# Altium schematic symbol library Wurth_Elektronik_Passive_rev16a.SCHLIB: 1143 symbols (part 15 of 27)
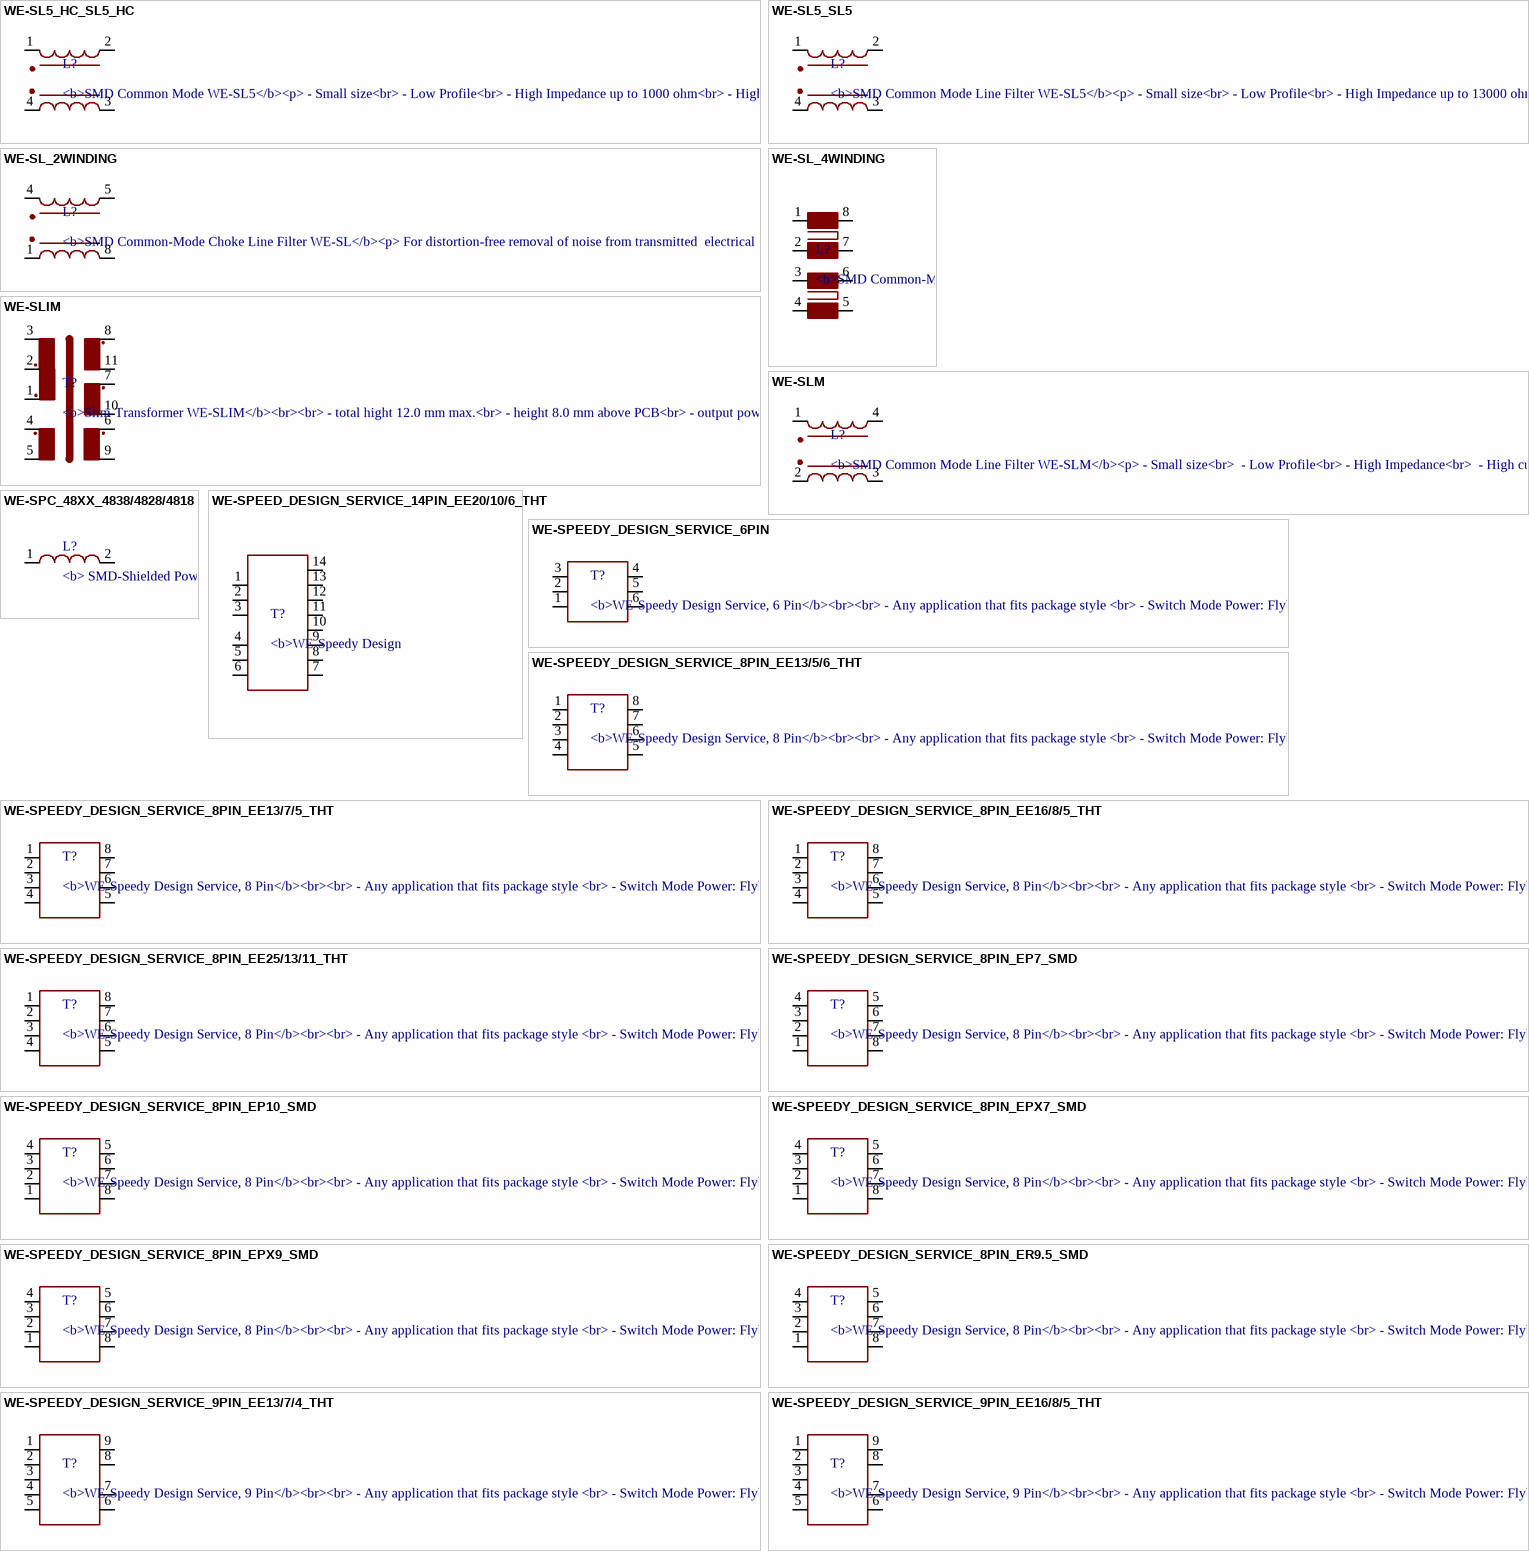
[diagram p72: symbols WE-SL5_HC_SL5_HC to WE-SPEEDY_DESIGN_SERVICE_9PIN_EE16/8/5_THT]

## WE-SL_4WINDING
designator L?, comment <b>SMD Common-Mode Choke Line Filter WE-SL</b><p> / For distortion-free removal of noise from transmitted / electrical signals<br> / - 2 or 4 winding configuration<br> / - Offering a wide band width with the core materials of NiZn and MnZn<br><br> / -- Current compensated choke for data and signal lines<br> / -- USB/CAN/ISDN-Bus<br> / -- Power supply systems<br> / -- Control lines<br> / -- LAN, PBX, cable TV, CD-ROM, 8mm video, etc. / <br><a href="http://katalog.we-online.de/media/images/eisos/IndSL_pf2.jpg" title="Enlarge picture"> / <img src="http://katalog.we-online.de/media/images/eisos/IndSL_pf2.jpg" width="320"></a><p> / Details see: <a href="http://katalog.we-online.de/en/pbs/WE-SL?">http://katalog.we-online.de/en/pbs/WE-SL?</a><p> / </b>Updated  by  Dan Xu 2014-07-11<br> / </b>2014 (C) Würth Elektronik
footprint WE-SL_4WINDING
pins: 1, 2, 3, 4, 5, 6, 7, 8

## WE-SLIM
designator T?, comment <b>Slim-Transformer WE-SLIM</b><br><br> / - total hight 12.0 mm max.<br> / - height 8.0 mm above PCB<br> / - output power 65W<br><br> / -- offline switch mode power supplies<br> / -- TV<br> / -- devices with heigh issues / <br><a href="http://katalog.we-online.de/media/images/ctm/UtSLIM_pf2.jpg" title="Enlarge picture"> / <img src="http://katalog.we-online.de/media/images/ctm/UtSLIM_pf2.jpg" width="320"></a><p> / Details see: <a href="http://katalog.we-online.de/en/ctm/MID-SLIM?">http://katalog.we-online.de/en/ctm/MID-SLIM?</a><p> / </b>Updated  by  Dan Xu 2014-07-11<br> / </b>2014 (C) Würth Elektronik
footprint WE_LEP28/11.2_6PIN
pins: 1, 2, 3, 4, 5, 6, 7, 8, 9, 10, 11

## WE-SLM
designator L?, comment <b>SMD Common Mode Line Filter WE-SLM</b><p> / - Small size<br> / - Low Profile<br> / - High Impedance<br> / - High current capability up to 300 mA<p> / -- USB<br> / -- CAN<br> / -- Firewire<br> / -- Data Lines<br> / -- Power supply systems<br> / -- Signal Lines / <br><a href="http://katalog.we-online.de/media/images/eisos/IndSLM_pf2.jpg" title="Enlarge picture"> / <img src="http://katalog.we-online.de/media/images/eisos/IndSLM_pf2.jpg" width="320"></a><p> / Details see: <a href="http://katalog.we-online.de/en/pbs/WE-SLM??">http://katalog.we-online.de/en/pbs/WE-SLM??</a><p> / </b>Updated  by  Dan Xu 2014-07-11<br> / </b>2014 (C) Würth Elektronik
footprint WE-SLM
pins: 1, 2 4, 3, 4 2

## WE-SPC_48XX_4838/4828/4818
designator L?, comment <b> SMD-Shielded Power Inductor  WE-SPC / <br><a href="http://katalog.we-online.de/media/images/eisos/IndSPC_pf2.jpg" title="Enlarge picture"> / <img src="http://katalog.we-online.de/media/images/eisos/IndSPC_pf2.jpg" width="320"></a><p> / Details see: <a href="http://katalog.we-online.de/en/pbs/WE-SPC?">http://katalog.we-online.de/en/pbs/WE-SPC?</a><p> / </b>Updated  by  Dan Xu 2014-07-11<br> / </b>2014 (C) Würth Elektronik
footprint WE-SPC_48XX
pins: 1, 2

## WE-SPEED_DESIGN_SERVICE_14PIN_EE20/10/6_THT
designator T?, comment <b>WE-Speedy Design Service, 14 Pin</b><br><br> / - Any application that fits package style <br> / - Switch Mode Power: Flyback, Forward, Push-Pull, Coupled Inductor<br><br> / -- Telecom Applications: xDSL, POTS Splitter Inductors
footprint WE_EE20/10/6_THT_HORIZONTAL_14PIN
pins: 1, 2, 3, 4, 5, 6, 7, 8, 9, 10, 11, 12, 13, 14

## WE-SPEEDY_DESIGN_SERVICE_6PIN
designator T?, comment <b>WE-Speedy Design Service, 6 Pin</b><br><br> / - Any application that fits package style <br> / - Switch Mode Power: Flyback, Forward, Push-Pull, Coupled Inductor<br><br> / -- Telecom Applications: xDSL, POTS Splitter Inductors
footprint WE_EP5_SMD_6PIN
pins: 1, 2, 3, 4, 5, 6

## WE-SPEEDY_DESIGN_SERVICE_8PIN_EE13/5/6_THT
designator T?, comment <b>WE-Speedy Design Service, 8 Pin</b><br><br> / - Any application that fits package style <br> / - Switch Mode Power: Flyback, Forward, Push-Pull, Coupled Inductor<br><br> / -- Telecom Applications: xDSL, POTS Splitter Inductors
footprint WE_EE13/5/6_HORIZONTAL_8PIN
pins: 1 4, 2 3, 3 2, 4 1, 5 8, 6 7, 7 6, 8 5

## WE-SPEEDY_DESIGN_SERVICE_8PIN_EE13/7/5_THT
designator T?, comment <b>WE-Speedy Design Service, 8 Pin</b><br><br> / - Any application that fits package style <br> / - Switch Mode Power: Flyback, Forward, Push-Pull, Coupled Inductor<br><br> / -- Telecom Applications: xDSL, POTS Splitter Inductors
footprint WE_EE13/7/4_HORIZONTAL_8PIN
pins: 1 4, 2 3, 3 2, 4 1, 5 8, 6 7, 7 6, 8 5

## WE-SPEEDY_DESIGN_SERVICE_8PIN_EE16/8/5_THT
designator T?, comment <b>WE-Speedy Design Service, 8 Pin</b><br><br> / - Any application that fits package style <br> / - Switch Mode Power: Flyback, Forward, Push-Pull, Coupled Inductor<br><br> / -- Telecom Applications: xDSL, POTS Splitter Inductors
footprint WE_EE16/8/5_THT_HORIZONTAL_8PIN
pins: 1 4, 2 3, 3 2, 4 1, 5 8, 6 7, 7 6, 8 5

## WE-SPEEDY_DESIGN_SERVICE_8PIN_EE25/13/11_THT
designator T?, comment <b>WE-Speedy Design Service, 8 Pin</b><br><br> / - Any application that fits package style <br> / - Switch Mode Power: Flyback, Forward, Push-Pull, Coupled Inductor<br><br> / -- Telecom Applications: xDSL, POTS Splitter Inductors
footprint WE_EE25/13/11_THT_VERTICAL_8PIN
pins: 1 4, 2 3, 3 2, 4 1, 5 8, 6 7, 7 6, 8 5

## WE-SPEEDY_DESIGN_SERVICE_8PIN_EP7_SMD
designator T?, comment <b>WE-Speedy Design Service, 8 Pin</b><br><br> / - Any application that fits package style <br> / - Switch Mode Power: Flyback, Forward, Push-Pull, Coupled Inductor<br><br> / -- Telecom Applications: xDSL, POTS Splitter Inductors
footprint WE_EP7_SMD_8PIN
pins: 1, 2, 3, 4, 5, 6, 7, 8

## WE-SPEEDY_DESIGN_SERVICE_8PIN_EP10_SMD
designator T?, comment <b>WE-Speedy Design Service, 8 Pin</b><br><br> / - Any application that fits package style <br> / - Switch Mode Power: Flyback, Forward, Push-Pull, Coupled Inductor<br><br> / -- Telecom Applications: xDSL, POTS Splitter Inductors
footprint WE_EP10_SMD_8PIN
pins: 1, 2, 3, 4, 5, 6, 7, 8

## WE-SPEEDY_DESIGN_SERVICE_8PIN_EPX7_SMD
designator T?, comment <b>WE-Speedy Design Service, 8 Pin</b><br><br> / - Any application that fits package style <br> / - Switch Mode Power: Flyback, Forward, Push-Pull, Coupled Inductor<br><br> / -- Telecom Applications: xDSL, POTS Splitter Inductors
footprint WE_EPX7_SMD_8PIN
pins: 1, 2, 3, 4, 5, 6, 7, 8

## WE-SPEEDY_DESIGN_SERVICE_8PIN_EPX9_SMD
designator T?, comment <b>WE-Speedy Design Service, 8 Pin</b><br><br> / - Any application that fits package style <br> / - Switch Mode Power: Flyback, Forward, Push-Pull, Coupled Inductor<br><br> / -- Telecom Applications: xDSL, POTS Splitter Inductors
footprint WE_EPX9_SMD_8PIN
pins: 1, 2, 3, 4, 5, 6, 7, 8

## WE-SPEEDY_DESIGN_SERVICE_8PIN_ER9.5_SMD
designator T?, comment <b>WE-Speedy Design Service, 8 Pin</b><br><br> / - Any application that fits package style <br> / - Switch Mode Power: Flyback, Forward, Push-Pull, Coupled Inductor<br><br> / -- Telecom Applications: xDSL, POTS Splitter Inductors
footprint WE_ER9.5_SMD_8PIN
pins: 1, 2, 3, 4, 5, 6, 7, 8

## WE-SPEEDY_DESIGN_SERVICE_9PIN_EE13/7/4_THT
designator T?, comment <b>WE-Speedy Design Service, 9 Pin</b><br><br> / - Any application that fits package style <br> / - Switch Mode Power: Flyback, Forward, Push-Pull, Coupled Inductor<br><br> / -- Telecom Applications: xDSL, POTS Splitter Inductors
footprint WE_E13/7/4_THT_HORIZONTAL_9PIN
pins: 1 5, 2 4, 3, 4 2, 5 1, 6 9, 7 8, 8 7, 9 6

## WE-SPEEDY_DESIGN_SERVICE_9PIN_EE16/8/5_THT
designator T?, comment <b>WE-Speedy Design Service, 9 Pin</b><br><br> / - Any application that fits package style <br> / - Switch Mode Power: Flyback, Forward, Push-Pull, Coupled Inductor<br><br> / -- Telecom Applications: xDSL, POTS Splitter Inductors
footprint WE_EE16/8/5_THT_HORIZONTAL_9PIN
pins: 1 5, 2 4, 3, 4 2, 5 1, 6 9, 7 8, 8 7, 9 6

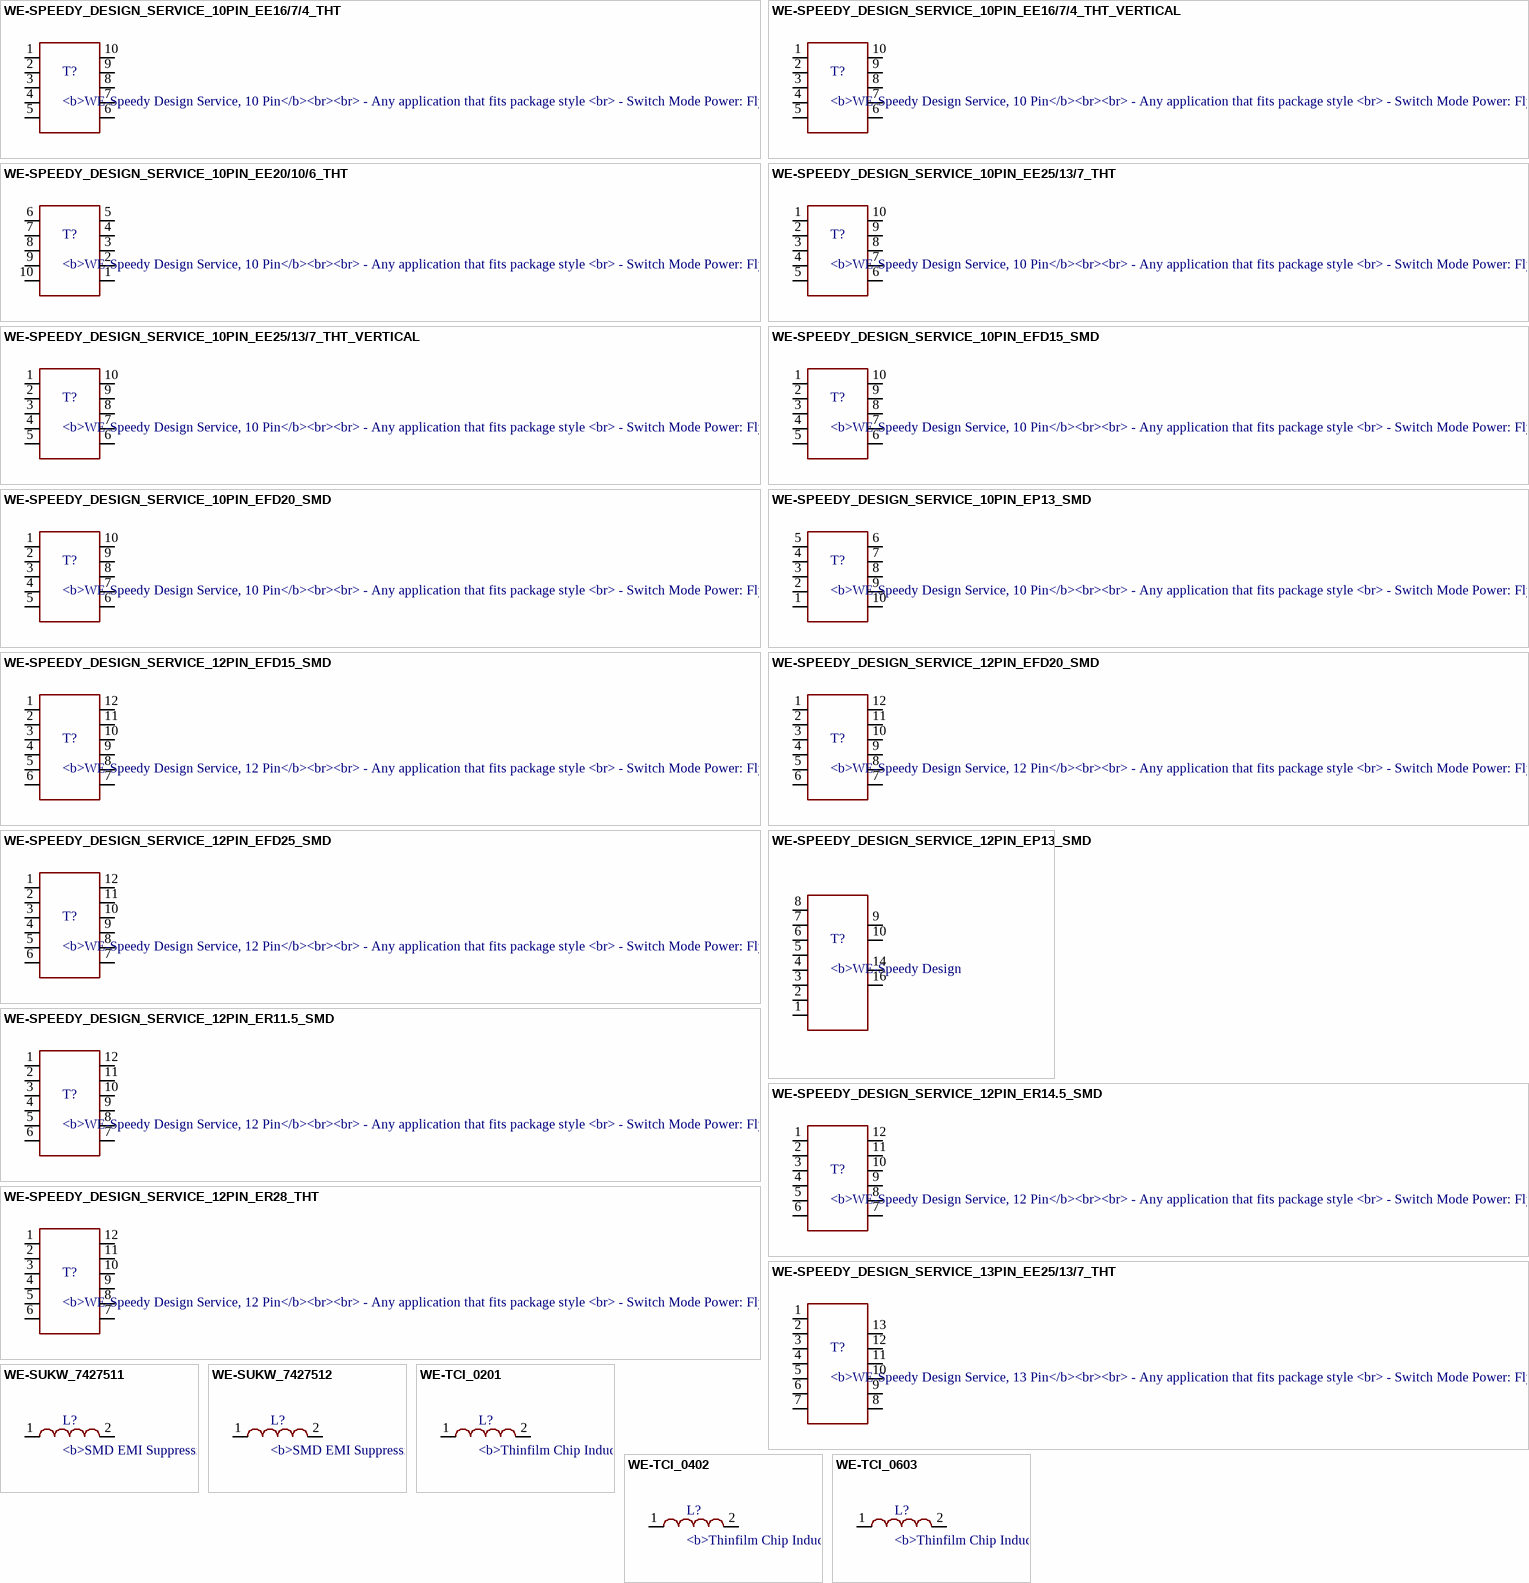
[diagram p45: symbols WE-SPEEDY_DESIGN_SERVICE_10PIN_EE16/7/4_THT to WE-TCI_0603]

## WE-SPEEDY_DESIGN_SERVICE_10PIN_EE16/7/4_THT
designator T?, comment <b>WE-Speedy Design Service, 10 Pin</b><br><br> / - Any application that fits package style <br> / - Switch Mode Power: Flyback, Forward, Push-Pull, Coupled Inductor<br><br> / -- Telecom Applications: xDSL, POTS Splitter Inductors
footprint WE_EE16/7/4_THT_HORIZONTAL_10PIN
pins: 1, 2, 3, 4, 5, 6, 7, 8, 9, 10

## WE-SPEEDY_DESIGN_SERVICE_10PIN_EE16/7/4_THT_VERTICAL
designator T?, comment <b>WE-Speedy Design Service, 10 Pin</b><br><br> / - Any application that fits package style <br> / - Switch Mode Power: Flyback, Forward, Push-Pull, Coupled Inductor<br><br> / -- Telecom Applications: xDSL, POTS Splitter Inductors
footprint WE_E16/7/4_THT_VERTIKAL_10PIN
pins: 1, 2, 3, 4, 5, 6, 7, 8, 9, 10

## WE-SPEEDY_DESIGN_SERVICE_10PIN_EE20/10/6_THT
designator T?, comment <b>WE-Speedy Design Service, 10 Pin</b><br><br> / - Any application that fits package style <br> / - Switch Mode Power: Flyback, Forward, Push-Pull, Coupled Inductor<br><br> / -- Telecom Applications: xDSL, POTS Splitter Inductors
footprint WE_EE20/10/6_THT_HORIZONTAL_10PIN
pins: 1 6, 2 7, 3 8, 4 9, 5 10, 6 1, 7 2, 8 3, 9 4, 10 5

## WE-SPEEDY_DESIGN_SERVICE_10PIN_EE25/13/7_THT
designator T?, comment <b>WE-Speedy Design Service, 10 Pin</b><br><br> / - Any application that fits package style <br> / - Switch Mode Power: Flyback, Forward, Push-Pull, Coupled Inductor<br><br> / -- Telecom Applications: xDSL, POTS Splitter Inductors
footprint WE_EE25/13/7_THT_HORIZONTAL_10PIN
pins: 1, 2, 3, 4, 5, 6, 7, 8, 9, 10

## WE-SPEEDY_DESIGN_SERVICE_10PIN_EE25/13/7_THT_VERTICAL
designator T?, comment <b>WE-Speedy Design Service, 10 Pin</b><br><br> / - Any application that fits package style <br> / - Switch Mode Power: Flyback, Forward, Push-Pull, Coupled Inductor<br><br> / -- Telecom Applications: xDSL, POTS Splitter Inductors
footprint WE_EE25/13/7_THT_VERTICAL_10PIN
pins: 1, 2, 3, 4, 5, 6, 7, 8, 9, 10

## WE-SPEEDY_DESIGN_SERVICE_10PIN_EFD15_SMD
designator T?, comment <b>WE-Speedy Design Service, 10 Pin</b><br><br> / - Any application that fits package style <br> / - Switch Mode Power: Flyback, Forward, Push-Pull, Coupled Inductor<br><br> / -- Telecom Applications: xDSL, POTS Splitter Inductors
footprint WE_EFD15_SMD_10PIN
pins: 1, 2, 3, 4, 5, 6, 7, 8, 9, 10

## WE-SPEEDY_DESIGN_SERVICE_10PIN_EFD20_SMD
designator T?, comment <b>WE-Speedy Design Service, 10 Pin</b><br><br> / - Any application that fits package style <br> / - Switch Mode Power: Flyback, Forward, Push-Pull, Coupled Inductor<br><br> / -- Telecom Applications: xDSL, POTS Splitter Inductors
footprint WE_EFD20_SMD_10PIN
pins: 1, 2, 3, 4, 5, 6, 7, 8, 9, 10

## WE-SPEEDY_DESIGN_SERVICE_10PIN_EP13_SMD
designator T?, comment <b>WE-Speedy Design Service, 10 Pin</b><br><br> / - Any application that fits package style <br> / - Switch Mode Power: Flyback, Forward, Push-Pull, Coupled Inductor<br><br> / -- Telecom Applications: xDSL, POTS Splitter Inductors
footprint WE_EP13_SMD_10PIN
pins: 1 5, 2 4, 3, 4 2, 5 1, 6 10, 7 9, 8, 9 7, 10 6

## WE-SPEEDY_DESIGN_SERVICE_12PIN_EFD15_SMD
designator T?, comment <b>WE-Speedy Design Service, 12 Pin</b><br><br> / - Any application that fits package style <br> / - Switch Mode Power: Flyback, Forward, Push-Pull, Coupled Inductor<br><br> / -- Telecom Applications: xDSL, POTS Splitter Inductors
footprint WE_EFD15_SMD_12PIN
pins: 1, 2, 3, 4, 5, 6, 7, 8, 9, 10, 11, 12

## WE-SPEEDY_DESIGN_SERVICE_12PIN_EFD20_SMD
designator T?, comment <b>WE-Speedy Design Service, 12 Pin</b><br><br> / - Any application that fits package style <br> / - Switch Mode Power: Flyback, Forward, Push-Pull, Coupled Inductor<br><br> / -- Telecom Applications: xDSL, POTS Splitter Inductors
footprint WE_EFD20_SMD_12PIN
pins: 1, 2, 3, 4, 5, 6, 7, 8, 9, 10, 11, 12

## WE-SPEEDY_DESIGN_SERVICE_12PIN_EFD25_SMD
designator T?, comment <b>WE-Speedy Design Service, 12 Pin</b><br><br> / - Any application that fits package style <br> / - Switch Mode Power: Flyback, Forward, Push-Pull, Coupled Inductor<br><br> / -- Telecom Applications: xDSL, POTS Splitter Inductors
footprint WE_EFD25_SMD_12PIN
pins: 1, 2, 3, 4, 5, 6, 7, 8, 9, 10, 11, 12

## WE-SPEEDY_DESIGN_SERVICE_12PIN_EP13_SMD
designator T?, comment <b>WE-Speedy Design Service, 12 Pin</b><br><br> / - Any application that fits package style <br> / - Switch Mode Power: Flyback, Forward, Push-Pull, Coupled Inductor<br><br> / -- Telecom Applications: xDSL, POTS Splitter Inductors
footprint WE_EP13_SMD_12PIN
pins: 1, 2, 3, 4, 5, 6, 7, 8, 9, 10, 14 11, 16 12

## WE-SPEEDY_DESIGN_SERVICE_12PIN_ER11.5_SMD
designator T?, comment <b>WE-Speedy Design Service, 12 Pin</b><br><br> / - Any application that fits package style <br> / - Switch Mode Power: Flyback, Forward, Push-Pull, Coupled Inductor<br><br> / -- Telecom Applications: xDSL, POTS Splitter Inductors
footprint WE_ER11.5_SMD_12PIN
pins: 1, 2, 3, 4, 5, 6, 7, 8, 9, 10, 11, 12

## WE-SPEEDY_DESIGN_SERVICE_12PIN_ER14.5_SMD
designator T?, comment <b>WE-Speedy Design Service, 12 Pin</b><br><br> / - Any application that fits package style <br> / - Switch Mode Power: Flyback, Forward, Push-Pull, Coupled Inductor<br><br> / -- Telecom Applications: xDSL, POTS Splitter Inductors
footprint WE_ER14.5_SMD_12PIN
pins: 1, 2, 3, 4, 5, 6, 7, 8, 9, 10, 11, 12

## WE-SPEEDY_DESIGN_SERVICE_12PIN_ER28_THT
designator T?, comment <b>WE-Speedy Design Service, 12 Pin</b><br><br> / - Any application that fits package style <br> / - Switch Mode Power: Flyback, Forward, Push-Pull, Coupled Inductor<br><br> / -- Telecom Applications: xDSL, POTS Splitter Inductors
footprint WE_ER28_THT_HORIZONTAL_12PIN
pins: 1, 2, 3, 4, 5, 6, 7, 8, 9, 10, 11, 12

## WE-SPEEDY_DESIGN_SERVICE_13PIN_EE25/13/7_THT
designator T?, comment <b>WE-Speedy Design Service, 13 Pin</b><br><br> / - Any application that fits package style <br> / - Switch Mode Power: Flyback, Forward, Push-Pull, Coupled Inductor<br><br> / -- Telecom Applications: xDSL, POTS Splitter Inductors
footprint WE_EE25/13/7_THT_HORIZONTAL_13PIN
pins: 1, 2, 3, 4, 5, 6, 7, 8, 9, 10, 11, 12, 13

## WE-SUKW_7427511
designator L?, comment <b>SMD EMI Suppression 5-Hole Ferrite Bead / <br> / <br> / <br><b> Characteristics / <br> / <br></b></b> Impedance up to 580 Ω / <br> / <br> SMD version for an easy installation on the PCB / <br> / <br> Special NiSn pad for improved soldering results / <br> / <br> Operating temperature: –40 ºC to +125 ºC / <br> / <br> / <br><b> Applications / <br> / <br></b> Protection against radio frequency interferences of components on PCB’s of PC’s, text processing and other digital devices / <br> / <br> Typical in power supply / <br> / <br> Power electronics / <br> / <br> / <br> / <br><a href="http://katalog.we-online.de/media/images/eisos/IndSPC_pf2.jpg" title="Enlarge picture"> / <img src="http://katalog.we-online.de/media/images/eisos/FeSUKW_pf2.jpg" width="320"></a><p> / Details see: <a href="http://katalog.we-online.de/en/pbs/WE-SUKW?">http://katalog.we-online.de/en/pbs/WE-SUKW?</a><p> / </b>Updated  by  Dan Xu 2014-07-11<br> / </b>2014 (C) Wurth Elektronik
footprint WE-SUKW_7427511
pins: 1, 2

## WE-SUKW_7427512
designator L?, comment <b>SMD EMI Suppression 5-Hole Ferrite Bead / <br> / <br> / <br><b> Characteristics / <br> / <br></b></b> Impedance up to 580 Ω / <br> / <br> SMD version for an easy installation on the PCB / <br> / <br> Special NiSn pad for improved soldering results / <br> / <br> Operating temperature: –40 ºC to +125 ºC / <br> / <br> / <br><b> Applications / <br> / <br></b> Protection against radio frequency interferences of components on PCB’s of PC’s, text processing and other digital devices / <br> / <br> Typical in power supply / <br> / <br> Power electronics / <br> / <br> / <br> / <br><a href="http://katalog.we-online.de/media/images/eisos/IndSPC_pf2.jpg" title="Enlarge picture"> / <img src="http://katalog.we-online.de/media/images/eisos/FeSUKW_pf2.jpg" width="320"></a><p> / Details see: <a href="http://katalog.we-online.de/en/pbs/WE-SUKW?">http://katalog.we-online.de/en/pbs/WE-SUKW?</a><p> / </b>Updated  by  Dan Xu 2014-07-11<br> / </b>2014 (C) Wurth Elektronik
footprint WE-SUKW_7427512
pins: 1, 2

## WE-TCI_0201
designator L?, comment <b>Thinfilm Chip Inductor / <br> / <br> / <br><b> Characteristics / <br> / <br></b></b> High self resonant frequency / <br> / <br> Tight tolerances of 2% (1% on request) or ± 0.1 nH and small inductance values / <br> / <br> Outstanding temperature stability / <br> / <br> In high frequency circuit the inductance is very stable / <br> / <br> Small inductance values / <br> / <br> Operating temperature: –40 ºC to +125 ºC / <br> / <br> / <br><b>Applications / <br> / <br></b> Mobile phone / <br> / <br> Pagers / <br> / <br> GPS products / <br> / <br> Wireless LAN / <br> / <br> Communication appliances / <br> / <br> RF Transceiver Module / <br> / <br> / <br> / <br><a href="http://katalog.we-online.de/media/images/eisos/RfTCI_pf2.jpg" title="Enlarge picture"> / <img src="http://katalog.we-online.de/media/images/eisos/RfTCI_pf2.jpg" width="320"></a><p> / Details see: <a href="http://katalog.we-online.de/en/pbs/WE-TCI?">http://katalog.we-online.de/en/pbs/WE-TCI?</a><p> / </b>Updated  by  Dan Xu 2014-07-11<br> / </b>2014 (C) Wurth Elektronik
footprint WE-TCI_0201
pins: 1, 2

## WE-TCI_0402
designator L?, comment <b>Thinfilm Chip Inductor / <br> / <br> / <br><b> Characteristics / <br> / <br></b></b> High self resonant frequency / <br> / <br> Tight tolerances of 2% (1% on request) or ± 0.1 nH and small inductance values / <br> / <br> Outstanding temperature stability / <br> / <br> In high frequency circuit the inductance is very stable / <br> / <br> Small inductance values / <br> / <br> Operating temperature: –40 ºC to +125 ºC / <br> / <br> / <br><b>Applications / <br> / <br></b> Mobile phone / <br> / <br> Pagers / <br> / <br> GPS products / <br> / <br> Wireless LAN / <br> / <br> Communication appliances / <br> / <br> RF Transceiver Module / <br> / <br> / <br> / <br><a href="http://katalog.we-online.de/media/images/eisos/RfTCI_pf2.jpg" title="Enlarge picture"> / <img src="http://katalog.we-online.de/media/images/eisos/RfTCI_pf2.jpg" width="320"></a><p> / Details see: <a href="http://katalog.we-online.de/en/pbs/WE-TCI?">http://katalog.we-online.de/en/pbs/WE-TCI?</a><p> / </b>Updated  by  Dan Xu 2014-07-11<br> / </b>2014 (C) Wurth Elektronik
footprint WE-TCI_0402
pins: 1, 2

## WE-TCI_0603
designator L?, comment <b>Thinfilm Chip Inductor / <br> / <br> / <br><b> Characteristics / <br> / <br></b></b> High self resonant frequency / <br> / <br> Tight tolerances of 2% (1% on request) or ± 0.1 nH and small inductance values / <br> / <br> Outstanding temperature stability / <br> / <br> In high frequency circuit the inductance is very stable / <br> / <br> Small inductance values / <br> / <br> Operating temperature: –40 ºC to +125 ºC / <br> / <br> / <br><b>Applications / <br> / <br></b> Mobile phone / <br> / <br> Pagers / <br> / <br> GPS products / <br> / <br> Wireless LAN / <br> / <br> Communication appliances / <br> / <br> RF Transceiver Module / <br> / <br> / <br> / <br><a href="http://katalog.we-online.de/media/images/eisos/RfTCI_pf2.jpg" title="Enlarge picture"> / <img src="http://katalog.we-online.de/media/images/eisos/RfTCI_pf2.jpg" width="320"></a><p> / Details see: <a href="http://katalog.we-online.de/en/pbs/WE-TCI?">http://katalog.we-online.de/en/pbs/WE-TCI?</a><p> / </b>Updated  by  Dan Xu 2014-07-11<br> / </b>2014 (C) Wurth Elektronik
footprint WE-TCI_0603
pins: 1, 2
